# Altium footprint library SPEC-A7.PcbLib: 90 footprints (part 3 of 6)
Each footprint in its own frame and in the unit in brackets; x right, y up, seen from the top. Pads: shape width x height; smd on the part's side, far side on the other; paste and mask are expansions set on the pad; w line width, h text height; cw(c..) or ccw(c..) is an arc to the next point about the centre after c.
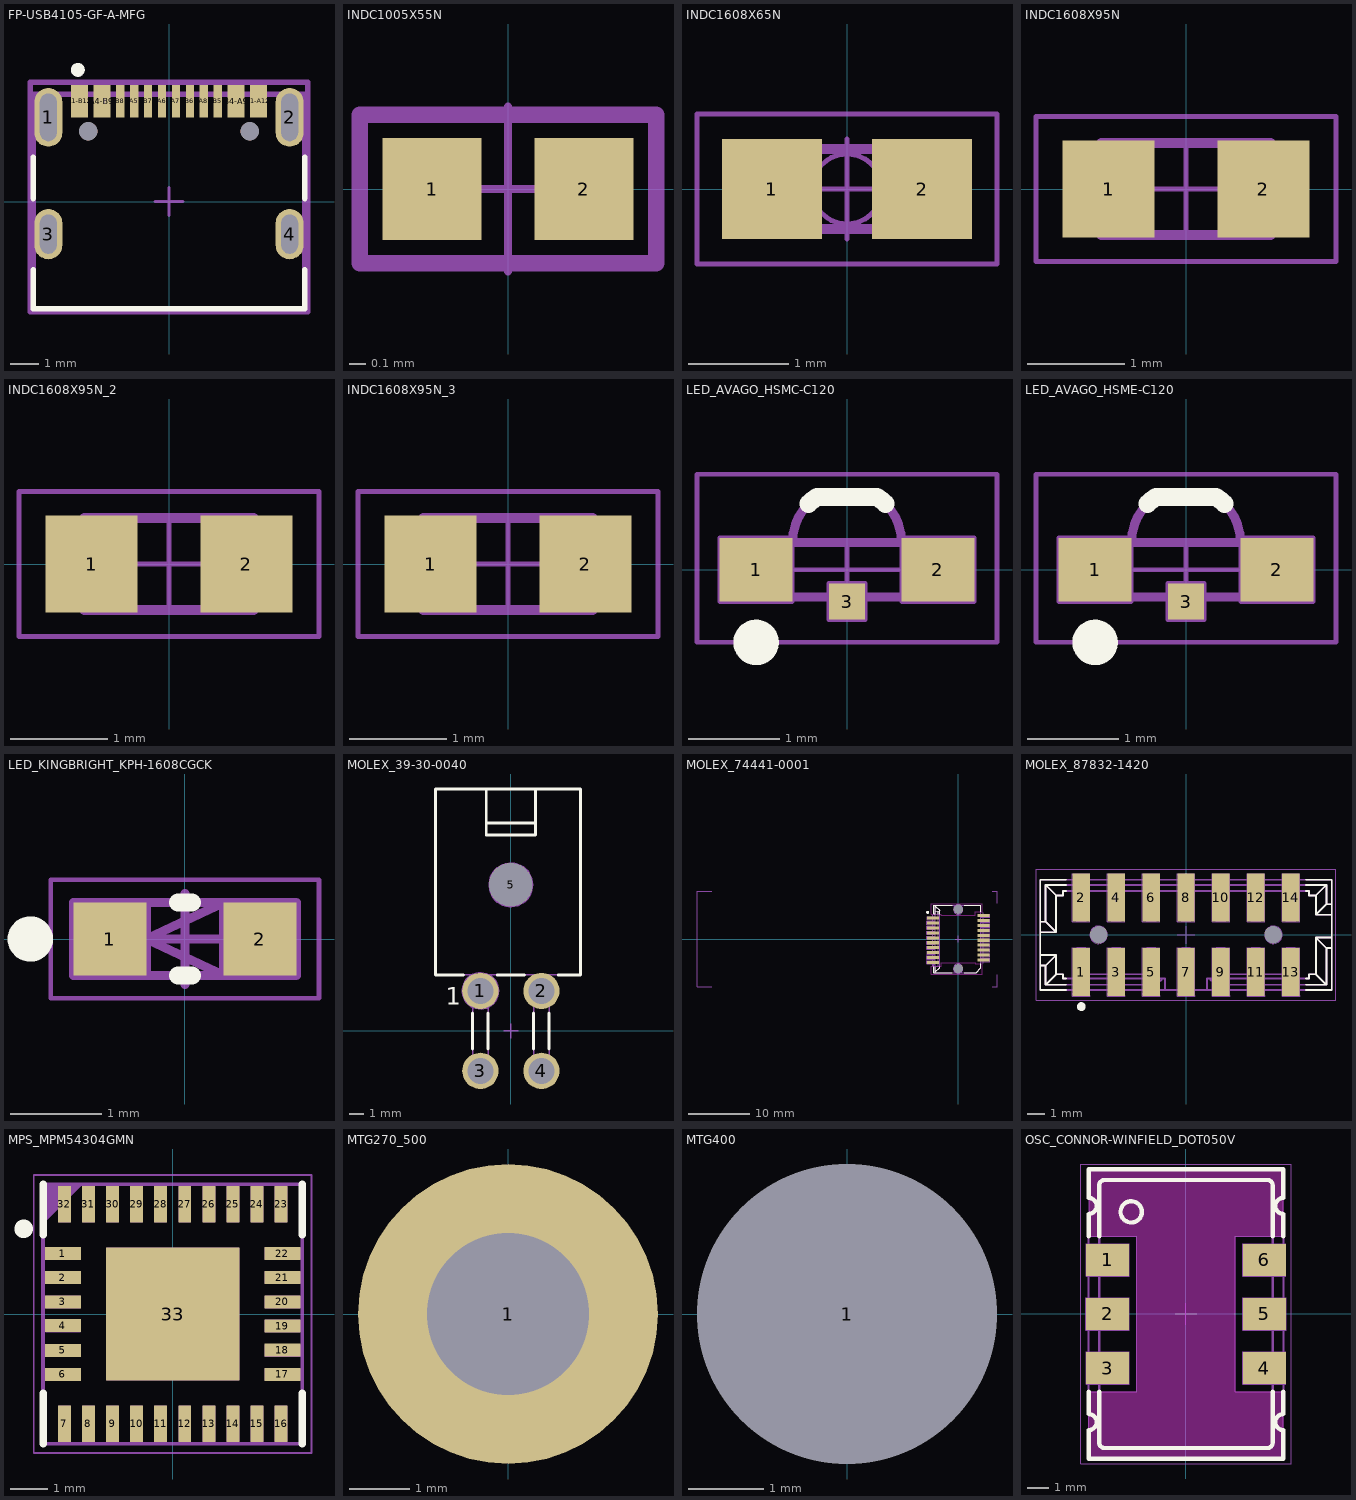
[diagram p2: the footprints below, top view; thin cyan lines are the x and y axes]

## FP-USB4105-GF-A-MFG [mm]
pads (18):
  rrect100% 1x2.1 hole 1.7 slot 0.6 at 0 deg paste-2539.97 mask+0: 1(-4.32,3.015) 2(4.32,3.015)
  rrect100% 1x1.8 hole 1.4 slot 0.6 at 0 deg paste-2539.97 mask+0: 3(-4.32,-1.165) 4(4.32,-1.165)
  rect 0.6x1.15 smd paste+0 mask+0: A1-B12(-3.2,3.59) A4-B9(-2.4,3.59) B1-A12(3.2,3.59) B4-A9(2.4,3.59)
  rect 0.3x1.15 smd paste+0 mask+0: A5(-1.25,3.59) A6(-0.25,3.59) A7(0.25,3.59) A8(1.25,3.59) B5(1.75,3.59) B6(0.75,3.59) B7(-0.75,3.59) B8(-1.75,3.59)
  round 0.65 hole 0.65 unplated paste-2539.97 mask+0: ""(-2.89,2.515) ""(2.89,2.515)
Top Overlay:
  circle w0.25: c-3.265,4.715 r0.125
  lines w0.2: -4.865,-2.44 -4.865,-3.84 4.865,-3.84 4.865,-2.44 ; -4.865,0.11 -4.865,1.59 ; 4.865,0.11 4.865,1.59
Top 3D Body:
  lines w0.2: -4.865,-3.84 4.865,-3.84 4.865,3.84 -4.865,3.84 -4.865,-3.84
Top Courtyard:
  lines w0.2: -4.965,-3.94 4.965,-3.94 4.965,4.265 -4.965,4.265 -4.965,-3.94
Top Assembly:
  lines w0.2: -4.965,-3.94 4.965,-3.94 4.965,4.265 -4.965,4.265 -4.965,-3.94
  text ".Designator" at 0,0.35 h1
Top Component Center:
  lines w0.1: -0.5,0 0.5,0 ; 0,-0.5 0,0.5
3D body "Conn_GCT_USB4105-GF-A_eec.STEP": height 0.25, standoff 0, extent -4.965,-3.94 4.965,4.265

## INDC1005X55N [mm]
pads (2):
  rect 0.6x0.62 smd: 1(-0.46,0) 2(0.46,0)
Mechanical 14:
  lines w0.1: -0.9,-0.45 0.9,-0.45 0.9,0.45 -0.9,0.45 -0.9,-0.45
Mechanical 15:
  lines w0.05: -0.5,0 0.5,0 ; 0,-0.5 0,0.5 ; -0.91,-0.46 0.91,-0.46 0.91,0.46 -0.91,0.46 -0.91,-0.46
3D body "INDC1005X55N.stp": height 0.55, standoff 0, extent -0.525,-0.275 0.525,0.275

## INDC1608X65N [mm]
pads (2):
  rect 1x1 smd: 1(-0.75,0) 2(0.75,0)
Mechanical 14:
  lines w0.1: -0.8,-0.4 0.8,-0.4 0.8,0.4 -0.8,0.4 -0.8,-0.4
Mechanical 15:
  circle w0.05: c0,0 r0.35
  lines w0.05: -0.5,0 0.5,0 ; 0,-0.5 0,0.5 ; -1.5,-0.75 1.5,-0.75 1.5,0.75 -1.5,0.75 -1.5,-0.75
3D body "INDC1608X65N.stp": height 0.65, standoff 0, extent -0.875,-0.475 0.875,0.475

## INDC1608X95N [mm]
pads (2):
  rect 0.95x1 smd: 1(-0.8,0) 2(0.8,0)
Mechanical 14:
  lines w0.1: -0.875,-0.475 -0.875,0.475 0.875,0.475 0.875,-0.475 -0.875,-0.475
Mechanical 15:
  lines w0.05: -0.5,0 0.5,0 ; 0,-0.5 0,0.5 ; -1.55,-0.75 -1.55,0.75 1.55,0.75 1.55,-0.75 -1.55,-0.75
3D body "INDC1608X95N.stp": height 0.95, standoff -0.05, extent -0.875,-0.475 0.875,0.475

## INDC1608X95N_2 [mm]
pads (2):
  rect 0.95x1 smd: 1(-0.8,0) 2(0.8,0)
Mechanical 14:
  lines w0.1: -0.875,-0.475 -0.875,0.475 0.875,0.475 0.875,-0.475 -0.875,-0.475
Mechanical 15:
  lines w0.05: -0.5,0 0.5,0 ; 0,-0.5 0,0.5 ; -1.55,-0.75 -1.55,0.75 1.55,0.75 1.55,-0.75 -1.55,-0.75
3D body "INDC1608X95N.stp": height 0.95, standoff -0.05, extent -0.875,-0.475 0.875,0.475

## INDC1608X95N_3 [mm]
pads (2):
  rect 0.95x1 smd: 1(-0.8,0) 2(0.8,0)
Mechanical 14:
  lines w0.1: -0.875,-0.475 -0.875,0.475 0.875,0.475 0.875,-0.475 -0.875,-0.475
Mechanical 15:
  lines w0.05: -0.5,0 0.5,0 ; 0,-0.5 0,0.5 ; -1.55,-0.75 -1.55,0.75 1.55,0.75 1.55,-0.75 -1.55,-0.75
3D body "INDC1608X95N.stp": height 0.95, standoff -0.05, extent -0.875,-0.475 0.875,0.475

## LED_AVAGO_HSMC-C120 [mm]
pads (3):
  rect 0.8x0.7 smd: 1(-1,0) 2(1,0)
  rect 0.4x0.4 smd: 3(0,-0.35)
Top Overlay:
  circle w0.25: c-1,-0.8 r0.125
  lines w0.2: -0.424,0.724 cw(c0,0.3) -0.332,0.8 0.332,0.8 cw(c0,0.3) 0.424,0.724
Mechanical 8:
  lines w0.05: -1,0 1,0 ; 0,-0.35 0,0 ; -1.4,-0.35 -0.6,-0.35 -0.6,0.35 -1.4,0.35 -1.4,-0.35 ; -0.2,-0.55 -0.2,-0.15 0.2,-0.15 0.2,-0.55 -0.2,-0.55 ; 0.6,-0.35 1.4,-0.35 1.4,0.35 0.6,0.35 0.6,-0.35
Mechanical 14:
  lines w0.1: -0.6,0.3 cw(c0,0.3) -0.332,0.8 0.332,0.8 cw(c0,0.3) 0.6,0.3 ; -0.85,-0.3 -0.85,0.3 0.85,0.3 0.85,-0.3 -0.85,-0.3
Mechanical 15:
  lines w0.05: -0.3,0 0.3,0 ; 0,-0.3 0,0.3 ; -1.65,-0.8 1.65,-0.8 1.65,1.05 -1.65,1.05 -1.65,-0.8
3D body "LED_AVAGO_HSMC-C120.stp": height 0.7, standoff 0, extent -0.85,-0.3 0.85,0.8

## LED_AVAGO_HSME-C120 [mm]
pads (3):
  rect 0.8x0.7 smd: 1(-1,0) 2(1,0)
  rect 0.4x0.4 smd: 3(0,-0.35)
Top Overlay:
  circle w0.25: c-1,-0.8 r0.125
  lines w0.2: -0.424,0.724 cw(c0,0.3) -0.332,0.8 0.332,0.8 cw(c0,0.3) 0.424,0.724
Mechanical 8:
  lines w0.05: -1,0 1,0 ; 0,-0.35 0,0 ; -1.4,-0.35 -0.6,-0.35 -0.6,0.35 -1.4,0.35 -1.4,-0.35 ; -0.2,-0.55 -0.2,-0.15 0.2,-0.15 0.2,-0.55 -0.2,-0.55 ; 0.6,-0.35 1.4,-0.35 1.4,0.35 0.6,0.35 0.6,-0.35
Mechanical 14:
  lines w0.1: -0.6,0.3 cw(c0,0.3) -0.332,0.8 0.332,0.8 cw(c0,0.3) 0.6,0.3 ; -0.85,-0.3 -0.85,0.3 0.85,0.3 0.85,-0.3 -0.85,-0.3
Mechanical 15:
  lines w0.05: -0.3,0 0.3,0 ; 0,-0.3 0,0.3 ; -1.65,-0.8 1.65,-0.8 1.65,1.05 -1.65,1.05 -1.65,-0.8
3D body "LED_AVAGO_HSME-C120.stp": height 0.7, standoff 0, extent -0.85,-0.3 0.85,0.8

## LED_KINGBRIGHT_KPH-1608CGCK [mm]
pads (2):
  rect 0.8x0.8 smd: 1(-0.825,0) 2(0.825,0)
Top Overlay:
  circle w0.25: c-1.7,0 r0.125
  lines w0.2: -0.075,-0.4 0.075,-0.4 ; -0.075,0.4 0.075,0.4
Mechanical 8:
  lines w0.1: -0.5,0 0,0 ; -0.425,0 0.425,0 ; 0,-0.5 0,0 ; 0,0.5 0,0 ; 0.5,0 0,0 ; -0.425,-0.4 -1.225,-0.4 -1.225,0.4 -0.425,0.4 ; -0.425,-0.4 -0.425,0.4 ; -0.425,-0.4 -0.825,0 -0.425,0.4 ; 1.225,-0.4 0.425,-0.4 0.425,0.4 1.225,0.4 ; 1.225,-0.4 1.225,0.4 ; 1.225,-0.4 0.825,0 1.225,0.4
Mechanical 14:
  lines w0.1: -0.8,-0.4 -0.8,0.4 0.8,0.4 0.8,-0.4 -0.8,-0.4 ; -0.425,0 0.425,0.4 0.425,-0.4 -0.425,0
Mechanical 15:
  lines w0.05: -1.475,-0.65 -1.475,0.65 1.475,0.65 1.475,-0.65 -1.475,-0.65
3D body "LED_KINGBRIGHT_KPH-1608CGCK_Part1.stp": height 0.2, standoff 0, extent -0.8,-0.4 0.8,0.4
3D body "LED_KINGBRIGHT_KPH-1608CGCK_Part2.stp": height 0.65, standoff 0.12, extent -0.6,-0.4 0.6,0.4

## MOLEX_39-30-0040 [mm]
pads (5):
  round 2.5 hole 1.8: 1(-2.1,2.75) 2(2.1,2.75) 3(-2.1,-2.75) 4(2.1,-2.75)
  round 1 hole 3 unplated mask+1: 5(0,10.05)
Top Overlay:
  lines w0.2: -3.262,3.85 -5.2,3.85 -5.2,16.65 4.8,16.65 4.8,3.85 3.262,3.85 ; -2.635,-1.242 -2.635,1.242 ; -1.7,14.3 1.7,14.3 ; -1.7,16.65 -1.7,13.478 1.7,13.478 1.7,16.65 ; -1.565,-1.242 -1.565,1.242 ; -0.938,3.85 0.938,3.85 ; 1.565,-1.242 1.565,1.242 ; 2.635,-1.242 2.635,1.242
  text "1" at -4.475,1.8 h1.2
Mechanical 8:
  circle w0.1: c-2.1,2.75 r1.25
  circle w0.1: c-2.1,2.75 r0.9
  circle w0.1: c0,10.05 r1.5
  lines w0.1: -2.6,-2.75 -2.1,-2.75 ; -2.6,2.75 -2.1,2.75 ; -2.1,-3.25 -2.1,-2.75 ; -2.1,-2.25 -2.1,-2.75 ; -2.1,2.25 -2.1,2.75 ; -2.1,3.25 -2.1,2.75 ; -1.6,-2.75 -2.1,-2.75 ; -1.6,2.75 -2.1,2.75 ; -0.5,0 0,0 ; -0.5,10.05 0,10.05 ; 0,-0.5 0,0 ; 0,0.5 0,0 ; 0,9.55 0,10.05 ; 0,10.55 0,10.05 ; 0.5,0 0,0 ; 0.5,10.05 0,10.05 ; 1.6,-2.75 2.1,-2.75 ; 1.6,2.75 2.1,2.75 ; 2.1,-3.25 2.1,-2.75 ; 2.1,-2.25 2.1,-2.75 ; 2.1,2.25 2.1,2.75 ; 2.1,3.25 2.1,2.75 ; 2.6,-2.75 2.1,-2.75 ; 2.6,2.75 2.1,2.75
Mechanical 14:
  lines w0.1: -2.635,3.85 -2.635,-3.285 -1.565,-3.285 -1.565,3.85 ; -1.7,14.3 1.7,14.3 ; -1.7,16.65 -1.7,13.478 1.7,13.478 1.7,16.65 ; 1.565,3.85 1.565,-3.285 2.635,-3.285 2.635,3.85 ; -5.2,3.85 -5.2,16.65 4.8,16.65 4.8,3.85 -5.2,3.85
  text "1" at -4.475,1.8 h1.2
3D body "MOLEX_39-30-0040.stp": height 11.4, standoff -3.6, extent -5.2,-3.285 4.8,16.65

## MOLEX_74441-0001 [mm]
pads (22):
  rect 2x0.5 smd: 1(-4.1,3.395) 2(-4.1,2.595) 3(-4.1,1.795) 4(-4.1,0.995) 5(-4.1,0.195) 6(-4.1,-0.605) 7(-4.1,-1.405) 8(-4.1,-2.205) 9(-4.1,-3.005) 10(-4.1,-3.805) 11(4.1,-3.405) 12(4.1,-2.605) 13(4.1,-1.805) 14(4.1,-1.005) 15(4.1,-0.205) 16(4.1,0.595) 17(4.1,1.395) 18(4.1,2.195) 19(4.1,2.995) 20(4.1,3.795)
  round 0.5 hole 1.55 unplated mask+0.525: MTG1(0,4.795) MTG2(0,-4.805)
Top Layer keep-out:
  lines w0.1: -4.34,-5.755 -4.34,-4.395 -2.78,-4.395 -2.78,-3.855 2.78,-3.855 2.78,-3.995 3.94,-3.995 3.94,-4.805 3.94,-5.755 -4.34,-5.755 ; -4.34,3.985 -4.34,5.745 3.94,5.745 3.94,4.385 2.78,4.385 2.78,3.845 -2.78,3.845 -2.78,3.985 -4.34,3.985
Top Overlay:
  circle w0.25: c-4.955,4.318 r0.125
  lines w0.2: -4,-4.505 -4,-5.505 -0.944,-5.505 ; -3.7,-5.505 -3.7,-4.505 ; -3.7,-5.305 -2.98,-4.705 -2.98,-4.505 ; -3.7,4.045 -3.7,5.495 ; -3.7,4.095 -4,4.095 -4,5.495 -0.944,5.495 ; -3.7,4.432 -2.98,4.495 ; -3.7,5.295 -2.98,4.695 -2.98,4.045 ; -3.223,4.045 -3.223,4.474 ; 0.944,-5.505 2.9,-5.505 3.7,-4.705 3.7,-4.055 ; 0.944,5.495 3.7,5.495 3.7,4.445
Mechanical 8:
  circle w0.1: c0,-4.805 r0.775
  circle w0.1: c0,4.795 r0.775
  lines w0.1: -40,-7.774 -42.4,-7.774 -42.4,7.774 -40,7.774 ; -4.6,-3.805 -4.1,-3.805 -3.6,-3.805 ; -4.6,-3.005 -4.1,-3.005 -3.6,-3.005 ; -4.6,-2.205 -4.1,-2.205 -3.6,-2.205 ; -4.6,-1.405 -4.1,-1.405 -3.6,-1.405 ; -4.6,-0.605 -4.1,-0.605 -3.6,-0.605 ; -4.6,0.195 -4.1,0.195 -3.6,0.195 ; -4.6,0.995 -4.1,0.995 -3.6,0.995 ; -4.6,1.795 -4.1,1.795 -3.6,1.795 ; -4.6,2.595 -4.1,2.595 -3.6,2.595 ; -4.6,3.395 -4.1,3.395 -3.6,3.395 ; -4.1,-4.305 -4.1,3.895 ; -0.5,-4.805 0,-4.805 ; -0.5,0 0,0 ; -0.5,4.795 0,4.795 ; 0,-5.305 0,-4.805 ; 0,-4.305 0,-4.805 ; 0,-0.5 0,0 ; 0,0.5 0,0 ; 0,4.295 0,4.795 ; 0,5.295 0,4.795 ; 0.5,-4.805 0,-4.805 ; 0.5,0 0,0 ; 0.5,4.795 0,4.795 ; 3.6,-3.405 4.1,-3.405 4.6,-3.405 ; 3.6,-2.605 4.1,-2.605 4.6,-2.605 ; 3.6,-1.805 4.1,-1.805 4.6,-1.805 ; 3.6,-1.005 4.1,-1.005 4.6,-1.005 ; 3.6,-0.205 4.1,-0.205 4.6,-0.205 ; 3.6,0.595 4.1,0.595 4.6,0.595 ; 3.6,1.395 4.1,1.395 4.6,1.395 ; 3.6,2.195 4.1,2.195 4.6,2.195 ; 3.6,2.995 4.1,2.995 4.6,2.995 ; 3.6,3.795 4.1,3.795 4.6,3.795 ; 4.1,-3.905 4.1,4.295 ; 5.5,-7.774 6.3,-7.774 6.3,-5.777 ; 5.5,7.774 6.3,7.774 6.3,5.777
Mechanical 14:
  circle w0.1: c-4.955,4.318 r0.125
  lines w0.1: -3.7,-5.505 -3.7,-4.105 ; -3.7,-5.305 -2.98,-4.705 -2.98,-4.505 ; -3.7,-4.442 -2.98,-4.505 ; -3.7,-4.055 -5.1,-4.055 -5.1,-3.555 -3.7,-3.555 ; -3.7,-3.255 -5.1,-3.255 -5.1,-2.755 -3.7,-2.755 ; -3.7,-2.455 -5.1,-2.455 -5.1,-1.955 -3.7,-1.955 ; -3.7,-1.655 -5.1,-1.655 -5.1,-1.155 -3.7,-1.155 ; -3.7,-0.855 -5.1,-0.855 -5.1,-0.355 -3.7,-0.355 ; -3.7,-0.055 -5.1,-0.055 -5.1,0.445 -3.7,0.445 ; -3.7,0.745 -5.1,0.745 -5.1,1.245 -3.7,1.245 ; -3.7,1.545 -5.1,1.545 -5.1,2.045 -3.7,2.045 ; -3.7,2.345 -5.1,2.345 -5.1,2.845 -3.7,2.845 ; -3.7,3.145 -5.1,3.145 -5.1,3.645 -3.7,3.645 ; -3.7,4.432 -2.98,4.495 ; -3.7,5.295 -2.985,4.695 -2.98,4.695 -2.98,4.495 ; -3.7,5.495 -3.7,4.095 ; -3.223,-4.484 -3.223,4.474 ; 3.7,-3.655 5.1,-3.655 5.1,-3.155 3.7,-3.155 ; 3.7,-2.855 5.1,-2.855 5.1,-2.355 3.7,-2.355 ; 3.7,-2.055 5.1,-2.055 5.1,-1.555 3.7,-1.555 ; 3.7,-1.255 5.1,-1.255 5.1,-0.755 3.7,-0.755 ; 3.7,-0.455 5.1,-0.455 5.1,0.045 3.7,0.045 ; 3.7,0.345 5.1,0.345 5.1,0.845 3.7,0.845 ; 3.7,1.145 5.1,1.145 5.1,1.645 3.7,1.645 ; 3.7,1.945 5.1,1.945 5.1,2.445 3.7,2.445 ; 3.7,2.745 5.1,2.745 5.1,3.245 3.7,3.245 ; 3.7,3.545 5.1,3.545 5.1,4.045 3.7,4.045 ; -3.7,-4.105 -3.7,4.095 ; -3.7,-4.105 -4,-4.105 -4,-5.505 2.9,-5.505 3.7,-4.705 3.7,5.495 -4,5.495 -4,4.095 -3.7,4.095 ; -2.98,-4.505 -2.98,4.495
3D body "MOLEX_74441-0001.stp": height 5.37, standoff -0.9, extent -4.54,-5.5 4.61,5.5

## MOLEX_87832-1420 [mm]
pads (16):
  rect 1x2.75 smd: 1(-6,-2.125) 2(-6,2.125) 3(-4,-2.125) 4(-4,2.125) 5(-2,-2.125) 6(-2,2.125) 7(0,-2.125) 8(0,2.125) 9(2,-2.125) 10(2,2.125) 11(4,-2.125) 12(4,2.125) 13(6,-2.125) 14(6,2.125)
  round 0.5 hole 1 unplated mask+0.25: 15(-5,0) 16(5,0)
Top Overlay:
  circle w0.25: c-5.985,-4.1 r0.125
  lines w0.1: -8.325,-1.75 -8.025,-1.75 ; -8.325,-1.15 -7.425,-1.15 ; -8.325,0.15 -7.425,0.15 ; -8.325,0.75 -8.025,0.75 ; -6.85,-3.15 -8.325,-3.15 -8.325,3.15 -6.85,3.15 ; -6.85,-2.85 -8.025,-2.85 ; -6.85,-2.5 -7.025,-2.5 -7.025,-2.25 -7.425,-2.25 ; -6.85,2.5 -7.025,2.5 -7.025,2.25 -7.425,2.25 ; -6.85,2.85 -8.025,2.85 ; 6.85,-3.15 8.325,-3.15 8.325,3.15 6.85,3.15 ; 6.85,-2.85 8.025,-2.85 ; 6.85,-2.5 7.025,-2.5 7.025,-2.25 7.425,-2.25 ; 6.85,2.5 7.025,2.5 7.025,2.25 7.425,2.25 ; 6.85,2.85 8.025,2.85 ; 8.325,-0.75 8.025,-0.75 ; 8.325,-0.15 7.425,-0.15 ; 8.325,1.15 7.425,1.15 ; 8.325,1.75 8.025,1.75 ; -8.025,-2.85 -7.425,-2.25 ; -8.025,-2.85 -8.025,-1.75 ; -8.025,-1.75 -7.425,-1.15 ; -8.025,0.75 -8.025,2.85 ; -8.025,0.75 -7.425,0.15 ; -8.025,2.85 -7.425,2.25 ; -7.425,-2.25 -7.425,-1.15 ; -7.425,0.15 -7.425,2.25 ; 7.425,-2.25 7.425,-0.15 ; 7.425,-2.25 8.025,-2.85 ; 7.425,-0.15 8.025,-0.75 ; 7.425,1.15 7.425,2.25 ; 7.425,1.15 8.025,1.75 ; 7.425,2.25 8.025,2.85 ; 8.025,-2.85 8.025,-0.75 ; 8.025,1.75 8.025,2.85
Mechanical 8:
  circle w0.05: c-5,0 r0.5
  circle w0.05: c5,0 r0.5
  lines w0.05: -5.5,0 -5,0 ; -5,-0.5 -5,0 ; -5,0.5 -5,0 ; -4.5,0 -5,0 ; -0.5,0 0,0 ; 0,-0.5 0,0 ; 0,0.5 0,0 ; 0.5,0 0,0 ; 4.5,0 5,0 ; 5,-0.5 5,0 ; 5,0.5 5,0 ; 5.5,0 5,0 ; -6.5,-3.5 -6,-2.125 -5.5,-3.5 ; -6.5,-3.5 -6.5,-0.75 -5.5,-0.75 -5.5,-3.5 ; -6.5,-3.5 -5.5,-3.5 ; -6.5,3.5 -6,2.125 -5.5,3.5 ; -6.5,3.5 -5.5,3.5 ; -6.5,3.5 -6.5,0.75 -5.5,0.75 -5.5,3.5 ; -4.5,-3.5 -4,-2.125 -3.5,-3.5 ; -4.5,-3.5 -4.5,-0.75 -3.5,-0.75 -3.5,-3.5 ; -4.5,-3.5 -3.5,-3.5 ; -4.5,3.5 -4,2.125 -3.5,3.5 ; -4.5,3.5 -3.5,3.5 ; -4.5,3.5 -4.5,0.75 -3.5,0.75 -3.5,3.5 ; -2.5,-3.5 -2,-2.125 -1.5,-3.5 ; -2.5,-3.5 -2.5,-0.75 -1.5,-0.75 -1.5,-3.5 ; -2.5,-3.5 -1.5,-3.5 ; -2.5,3.5 -2,2.125 -1.5,3.5 ; -2.5,3.5 -1.5,3.5 ; -2.5,3.5 -2.5,0.75 -1.5,0.75 -1.5,3.5 ; -0.5,-3.5 0,-2.125 0.5,-3.5 ; -0.5,-3.5 -0.5,-0.75 0.5,-0.75 0.5,-3.5 ; -0.5,-3.5 0.5,-3.5 ; -0.5,3.5 0,2.125 0.5,3.5 ; -0.5,3.5 0.5,3.5 ; -0.5,3.5 -0.5,0.75 0.5,0.75 0.5,3.5 ; 1.5,-3.5 2,-2.125 2.5,-3.5 ; 1.5,-3.5 1.5,-0.75 2.5,-0.75 2.5,-3.5 ; 1.5,-3.5 2.5,-3.5 ; 1.5,3.5 2,2.125 2.5,3.5 ; 1.5,3.5 2.5,3.5 ; 1.5,3.5 1.5,0.75 2.5,0.75 2.5,3.5 ; 3.5,-3.5 4,-2.125 4.5,-3.5 ; 3.5,-3.5 3.5,-0.75 4.5,-0.75 4.5,-3.5 ; 3.5,-3.5 4.5,-3.5 ; 3.5,3.5 4,2.125 4.5,3.5 ; 3.5,3.5 4.5,3.5 ; 3.5,3.5 3.5,0.75 4.5,0.75 4.5,3.5 ; 5.5,-3.5 6,-2.125 6.5,-3.5 ; 5.5,-3.5 5.5,-0.75 6.5,-0.75 6.5,-3.5 ; 5.5,-3.5 6.5,-3.5 ; 5.5,3.5 6,2.125 6.5,3.5 ; 5.5,3.5 6.5,3.5 ; 5.5,3.5 5.5,0.75 6.5,0.75 6.5,3.5
Mechanical 14:
  drawing of 236 lines, arcs and shapes, not listed
Mechanical 15:
  lines w0.05: -8.575,-3.75 -8.575,3.75 8.575,3.75 8.575,-3.75 -8.575,-3.75
3D body "MOLEX_87832-1420.stp": height 7.6, standoff -0.75, extent -8.325,-3.15 8.325,3.15

## MPS_MPM54304GMN [mm]
pads (33):
  rect 0.975x0.35 smd paste-2539.97 mask-0.025: 1(-2.963,1.633) 2(-2.963,0.983) 3(-2.963,0.325) 4(-2.963,-0.313) 5(-2.963,-0.983) 6(-2.963,-1.633) 17(2.963,-1.633) 18(2.963,-0.975) 19(2.963,-0.325) 20(2.963,0.325) 21(2.963,0.983) 22(2.963,1.633)
  rect 0.35x0.975 smd paste-2539.97 mask-0.025: 7(-2.925,-2.963) 8(-2.275,-2.963) 9(-1.625,-2.963) 10(-0.975,-2.963) 11(-0.325,-2.963) 12(0.325,-2.963) 13(0.975,-2.963) 14(1.625,-2.963) 15(2.275,-2.963) 16(2.925,-2.963) 23(2.925,2.963) 24(2.275,2.963) 25(1.625,2.963) 26(0.975,2.963) 27(0.325,2.963) 28(-0.325,2.963) 29(-0.975,2.963) 30(-1.625,2.963) 31(-2.275,2.963) 32(-2.925,2.963)
  rect 3.6x3.6 smd paste-2539.97 mask-0.25: 33(0,0)
Top Overlay:
  circle w0.25: c-4.025,2.3 r0.125
  lines w0.2: -3.5,-3.5 -3.5,-2.133 ; -3.5,2.133 -3.5,3.5 ; 3.5,-3.5 3.5,-2.133 ; 3.5,2.133 3.5,3.5
Top Paste:
  region: -1.775,-1.775 -1.775,1.775 1.775,1.775 1.775,-1.775
  region: 2.5,1.483 2.5,1.783 3.425,1.783 3.425,1.483
  region: 2.5,0.833 2.5,1.133 3.425,1.133 3.425,0.833
  region: 2.5,0.175 2.5,0.475 3.425,0.475 3.425,0.175
  region: 2.5,-0.475 2.5,-0.175 3.425,-0.175 3.425,-0.475
  region: 2.5,-1.125 2.5,-0.825 3.425,-0.825 3.425,-1.125
  region: 2.5,-1.783 2.5,-1.483 3.425,-1.483 3.425,-1.783
  region: -3.425,-1.133 -3.425,-0.833 -2.5,-0.833 -2.5,-1.133
  region: -3.425,-0.463 -3.425,-0.163 -2.5,-0.163 -2.5,-0.463
  region: -3.425,0.175 -3.425,0.475 -2.5,0.475 -2.5,0.175
  region: -3.425,0.833 -3.425,1.133 -2.5,1.133 -2.5,0.833
  region: -3.425,1.483 -3.425,1.783 -2.5,1.783 -2.5,1.483
  region: -3.425,-1.783 -3.425,-1.483 -2.5,-1.483 -2.5,-1.783
  region: -1.125,2.5 -1.125,3.425 -0.825,3.425 -0.825,2.5
  region: 2.775,2.5 2.775,3.425 3.075,3.425 3.075,2.5
  region: -0.475,2.5 -0.475,3.425 -0.175,3.425 -0.175,2.5
  region: 1.475,2.5 1.475,3.425 1.775,3.425 1.775,2.5
  region: 0.825,2.5 0.825,3.425 1.125,3.425 1.125,2.5
  region: 0.175,2.5 0.175,3.425 0.475,3.425 0.475,2.5
  region: -1.775,2.5 -1.775,3.425 -1.475,3.425 -1.475,2.5
  region: 2.125,2.5 2.125,3.425 2.425,3.425 2.425,2.5
  region: -2.425,2.5 -2.425,3.425 -2.125,3.425 -2.125,2.5
  region: -3.075,2.5 -3.075,3.425 -2.775,3.425 -2.775,2.5
  region: -0.475,-3.425 -0.475,-2.5 -0.175,-2.5 -0.175,-3.425
  region: 0.175,-3.425 0.175,-2.5 0.475,-2.5 0.475,-3.425
  region: -1.125,-3.425 -1.125,-2.5 -0.825,-2.5 -0.825,-3.425
  region: 1.475,-3.425 1.475,-2.5 1.775,-2.5 1.775,-3.425
  region: 0.825,-3.425 0.825,-2.5 1.125,-2.5 1.125,-3.425
  region: 2.125,-3.425 2.125,-2.5 2.425,-2.5 2.425,-3.425
  region: -1.775,-3.425 -1.775,-2.5 -1.475,-2.5 -1.475,-3.425
  region: 2.775,-3.425 2.775,-2.5 3.075,-2.5 3.075,-3.425
  region: -2.425,-3.425 -2.425,-2.5 -2.125,-2.5 -2.125,-3.425
  region: -3.075,-3.425 -3.075,-2.5 -2.775,-2.5 -2.775,-3.425
Mechanical 8:
  drawing of 200 lines, arcs and shapes, not listed
Mechanical 14:
  lines w0.1: -3.5,2.5 -2.5,3.5 ; -3.5,2.6 -2.6,3.5 ; -3.5,2.7 -2.7,3.5 ; -3.5,2.8 -2.8,3.5 ; -3.5,2.9 -2.9,3.5 ; -3.5,3 -3,3.5 ; -3.5,3.1 -3.1,3.5 ; -3.5,3.2 -3.2,3.5 ; -3.5,3.3 -3.3,3.5 ; -3.5,3.4 -3.4,3.5 ; -3.5,-3.5 3.5,-3.5 3.5,3.5 -3.5,3.5 -3.5,-3.5
Mechanical 15:
  lines w0.05: -3.75,-3.75 3.75,-3.75 3.75,3.75 -3.75,3.75 -3.75,-3.75
Drill Drawing:
  lines w0.1: -3.95,-3.95 3.95,-3.95 3.95,3.95 -3.95,3.95 -3.95,-3.95
  text "soldermask defined pads,  / do not increase/decrease  / soldermask aperture in this area" at -13.625,-10.641 h1.2
3D body "MPS_MPM54304GMN.stp": height 2.1, standoff 0, extent -3.5,-3.5 3.5,3.5

## MTG270_500 [mm]
pads (1):
  round 5 hole 2.7: 1(0,0)

## MTG400 [mm]
pads (1):
  round 1 hole 4 unplated mask+1.5: 1(0,0)

## OSC_CONNOR-WINFIELD_DOT050V [mm]
pads (6):
  rect 2.03x1.52 smd: 1(-3.685,2.54) 2(-3.685,0) 3(-3.685,-2.54) 4(3.685,-2.54) 5(3.685,0) 6(3.685,2.54)
Top Layer keep-out:
  region: -4.55,6.8 4.575,6.8 4.575,3.675 4.55,3.65 2.32,3.65 2.32,-3.65 4.575,-3.65 4.575,-6.8 -4.575,-6.8 -4.575,-3.675 -4.55,-3.65 -2.32,-3.65 -2.32,3.65 -4.55,3.65
Top Overlay:
  circle w0.2: c-2.575,4.8 r0.5
  lines w0.2: -4.575,-3.65 -4.575,-4.705 cw(c-4.575,-5.08) -4.575,-5.455 -4.575,-6.8 4.575,-6.8 4.575,-5.455 cw(c4.575,-5.08) 4.575,-4.705 4.575,-3.65 ; -4.575,3.65 -4.575,4.705 ccw(c-4.575,5.08) -4.575,5.455 -4.575,6.8 4.575,6.8 4.575,5.455 ccw(c4.575,5.08) 4.575,4.705 4.575,3.65 ; -4.075,-3.65 -4.075,-6.05 ccw(c-3.825,-6.05) -3.825,-6.3 3.825,-6.3 ccw(c3.825,-6.05) 4.075,-6.05 4.075,-3.65 ; -4.075,3.65 -4.075,6.05 cw(c-3.825,6.05) -3.825,6.3 3.825,6.3 cw(c3.825,6.05) 4.075,6.05 4.075,3.65
Mechanical 8:
  lines w0.05: -4.575,-3.65 -4.575,-6.8 4.575,-6.8 4.575,-3.65 ; -4.55,-3.65 -2.32,-3.65 -2.32,3.65 -4.55,3.65 ; -4.55,3.675 -4.55,6.8 4.575,6.8 4.575,3.675 ; -4.185,-2.54 -3.685,-2.54 ; -4.185,0 -3.685,0 ; -4.185,2.54 -3.685,2.54 ; -3.685,-3.04 -3.685,-2.54 ; -3.685,-2.04 -3.685,-2.54 ; -3.685,-0.5 -3.685,0 ; -3.685,0.5 -3.685,0 ; -3.685,2.04 -3.685,2.54 ; -3.685,3.04 -3.685,2.54 ; -3.185,-2.54 -3.685,-2.54 ; -3.185,0 -3.685,0 ; -3.185,2.54 -3.685,2.54 ; -0.5,0 0,0 ; 0,-0.5 0,0 ; 0,0.5 0,0 ; 0.5,0 0,0 ; 3.185,-2.54 3.685,-2.54 ; 3.185,0 3.685,0 ; 3.185,2.54 3.685,2.54 ; 3.685,-3.04 3.685,-2.54 ; 3.685,-2.04 3.685,-2.54 ; 3.685,-0.5 3.685,0 ; 3.685,0.5 3.685,0 ; 3.685,2.04 3.685,2.54 ; 3.685,3.04 3.685,2.54 ; 4.185,-2.54 3.685,-2.54 ; 4.185,0 3.685,0 ; 4.185,2.54 3.685,2.54 ; 4.55,-3.65 2.32,-3.65 2.32,3.65 4.55,3.65 ; -4.7,-3.3 -4.7,-1.78 -2.67,-1.78 -2.67,-3.3 -4.7,-3.3 ; -4.7,-0.76 -4.7,0.76 -2.67,0.76 -2.67,-0.76 -4.7,-0.76 ; -4.7,1.78 -4.7,3.3 -2.67,3.3 -2.67,1.78 -4.7,1.78 ; 2.67,-3.3 2.67,-1.78 4.7,-1.78 4.7,-3.3 2.67,-3.3 ; 2.67,-0.76 2.67,0.76 4.7,0.76 4.7,-0.76 2.67,-0.76 ; 2.67,1.78 2.67,3.3 4.7,3.3 4.7,1.78 2.67,1.78
Mechanical 14:
  circle w0.1: c-2.575,4.8 r0.5
  lines w0.1: -4.575,-6.8 4.575,-6.8 4.575,-5.455 cw(c4.575,-5.08) 4.575,-4.705 4.575,-2.915 cw(c4.575,-2.54) 4.575,-2.165 4.575,-0.375 cw(c4.575,0) 4.575,0.375 4.575,2.165 cw(c4.575,2.54) 4.575,2.915 4.575,4.705 cw(c4.575,5.08) 4.575,5.455 4.575,6.8 -4.575,6.8 -4.575,5.455 cw(c-4.575,5.08) -4.575,4.705 -4.575,2.915 cw(c-4.575,2.54) -4.575,2.165 -4.575,0.375 cw(c-4.575,0) -4.575,-0.375 -4.575,-2.165 cw(c-4.575,-2.54) -4.575,-2.915 -4.575,-4.705 cw(c-4.575,-5.08) -4.575,-5.455 -4.575,-6.8 ; -4.075,-6.05 ccw(c-3.825,-6.05) -3.825,-6.3 3.825,-6.3 ccw(c3.825,-6.05) 4.075,-6.05 4.075,6.05 ccw(c3.825,6.05) 3.825,6.3 -3.825,6.3 ccw(c-3.825,6.05) -4.075,6.05 -4.075,-6.05
Mechanical 15:
  lines w0.05: -4.95,-7.05 -4.95,7.05 4.95,7.05 4.95,-7.05 -4.95,-7.05
3D body "OSC_CONNOR-WINFIELD_DOT050V.stp": height 6.86, standoff 0, extent -4.575,-6.8 4.575,6.8